# Altium footprint library microbuilder.PCBLIB: 422 footprints (part 8 of 27)
Each footprint in its own frame and in the unit in brackets; x right, y up, seen from the top. Pads: shape width x height; smd on the part's side, far side on the other; paste and mask are expansions set on the pad; w line width, h text height; cw(c..) or ccw(c..) is an arc to the next point about the centre after c.
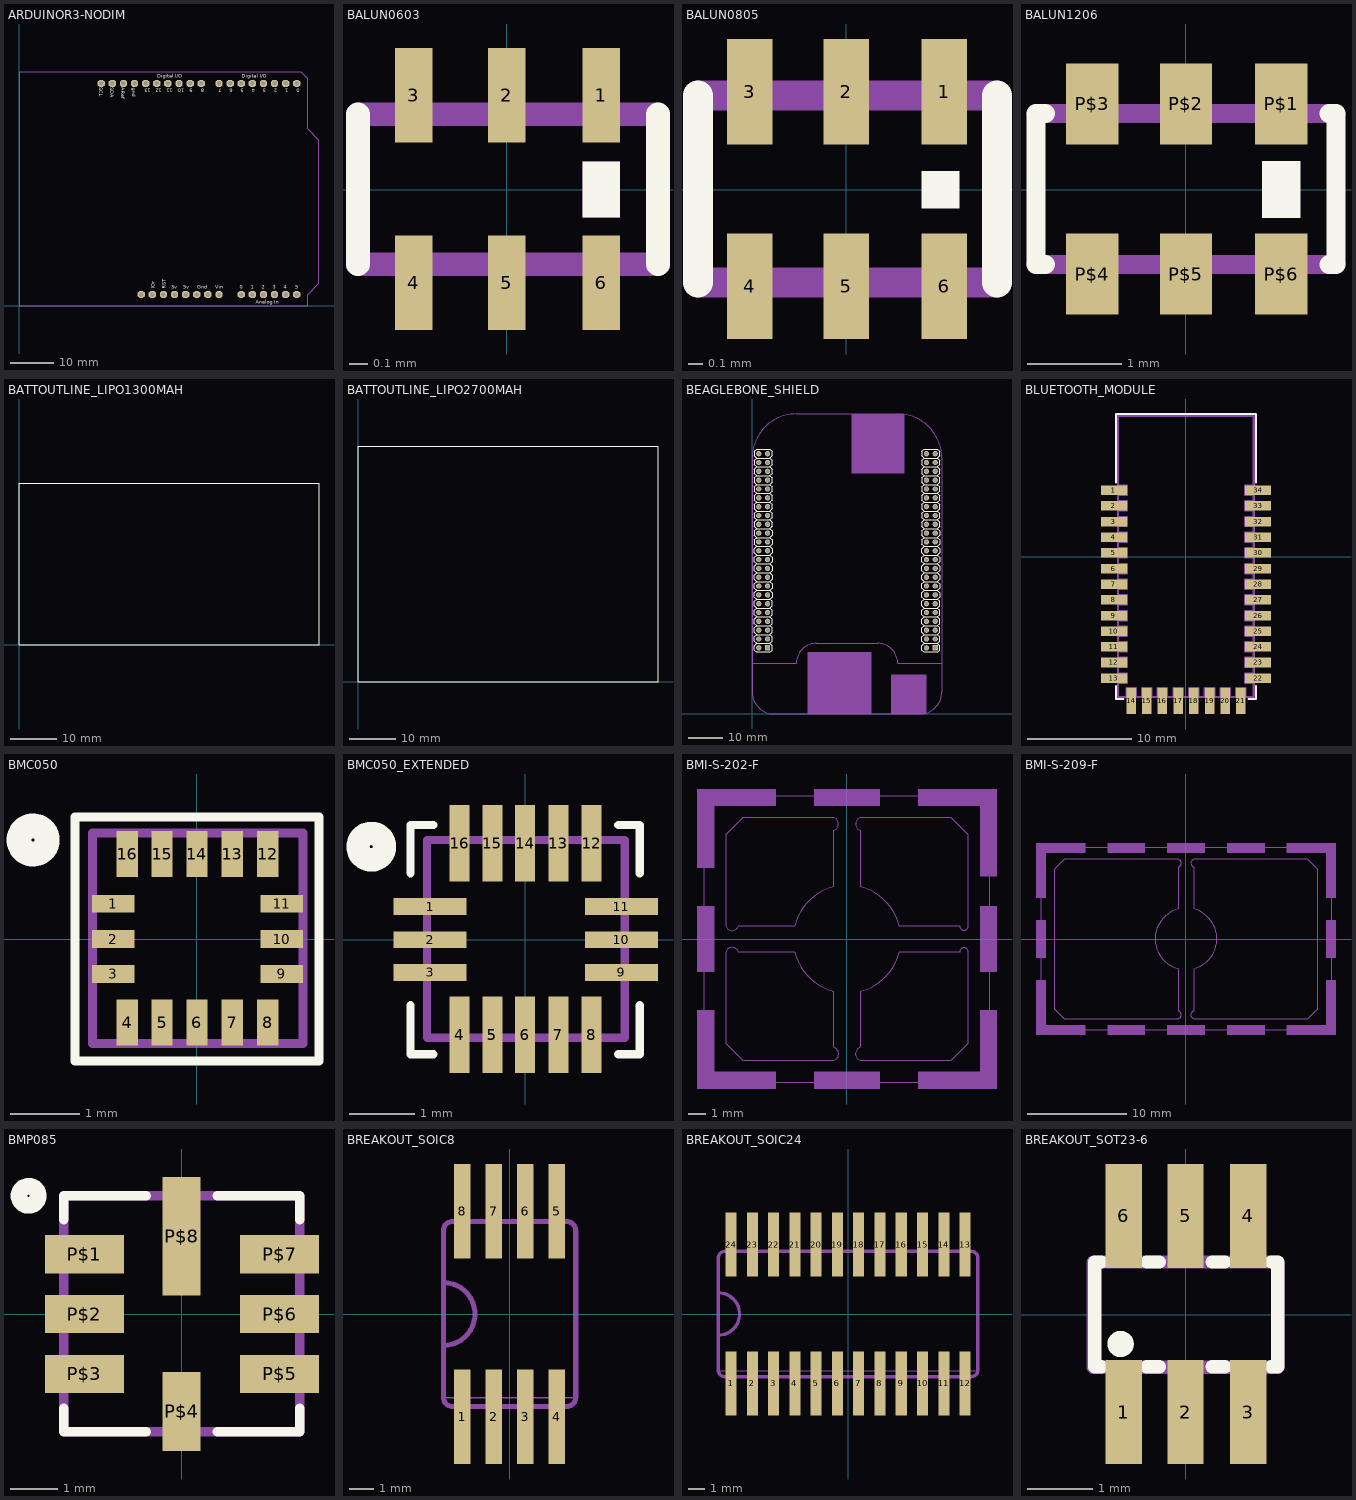
[diagram p7: the footprints below, top view; thin cyan lines are the x and y axes]

## ARDUINOR3-NODIM [mil]
pads (32):
  oct 66x66 hole 40: 3V(1400,100) 5V(1500,100) A0(2000,100) A1(2100,100) A2(2200,100) A3(2300,100) A4(2400,100) A5(2500,100) AREF(940,2000) D0(2500,2000) D1(2400,2000) D2(2300,2000) D3(2200,2000) D4(2100,2000) D5(2000,2000) D6(1900,2000) D7(1800,2000) D8(1640,2000) D9(1540,2000) D10(1440,2000) D11(1340,2000) D12(1240,2000) D13(1140,2000) GND(1040,2000) GND1(1700,100) GND2(1600,100) IOREF(1200,100) RESERVED(1100,100) RESET(1300,100) SCL(740,2000) SDA(840,2000) VIN(1800,100)
Top Overlay:
  text "RST" at 1320,150 h34
  text "3v" at 1369,150 h34
  text "5v" at 1479,150 h34
  text "Gnd" at 1606,150 h34
  text "Vin" at 1764,150 h34
  text "Analog In" at 2131,19 h34
  text "0" at 1985,150 h34
  text "1" at 2085,150 h34
  text "2" at 2185,150 h34
  text "3" at 2285,150 h34
  text "4" at 2385,150 h34
  text "5" at 2485,150 h34
  text "ARef" at 920,1965 h34
  text "gnd" at 1020,1960 h34
  text "13" at 1185,1950 h34
  text "12" at 1285,1950 h34
  text "11" at 1385,1950 h34
  text "10" at 1485,1950 h34
  text "9" at 1565,1950 h34
  text "8" at 1665,1950 h34
  text "7" at 1825,1950 h34
  text "6" at 1925,1950 h34
  text "5" at 2025,1950 h34
  text "4" at 2125,1950 h34
  text "3" at 2225,1950 h34
  text "2" at 2325,1950 h34
  text "1" at 2425,1950 h34
  text "0" at 2525,1950 h34
  text "Digital I/O" at 1245,2050 h34
  text "Digital I/O" at 2005,2050 h34
  text "SCL" at 720,1965 h34
  text "SDA" at 820,1965 h34
  text "IOr" at 1220,150 h34
Mechanical 16:
  lines w0: 0,0 2600,0 2600,100 2700,200 2700,1490 2600,1590 2600,2040 2540,2100 0,2100 0,0

## BALUN0603 [mil]
pads (6):
  rect 8x20 smd: 1(20,20) 2(0,20) 3(-19.68,20) 4(-19.68,-19.68) 5(0,-19.68) 6(20,-19.68)
Top Overlay:
  rectangle: 16,-5.91 24,6
  lines w5: -31.5,-15.75 -31.5,16 ; 32,-15.75 32,16
Mechanical 16:
  rectangle: 16,-5.91 24,6
  lines w5: -31.5,-15.75 32,-15.75 32,16 -31.5,16 -31.5,-15.75

## BALUN0805 [mil]
pads (6):
  rect 12x28 smd: 1(26,26) 2(0,26) 3(-25.59,26) 4(-25.59,-25.59) 5(0,-25.59) 6(26,-25.59)
Top Overlay:
  rectangle: 20,-5 30,5
  lines w8: -39.37,-24.61 -39.37,25 ; 40,-24.61 40,25
Mechanical 16:
  lines w5: -39.37,-24.61 -39.37,25 ; 40,-24.61 40,25
  lines w8: -39.37,-24.61 40,-24.61 ; -39.37,25 40,25

## BALUN1206 [mil]
pads (6):
  rect 22x34 smd: P$1(40,36) P$2(0,36) P$3(-39.37,36) P$4(-39.37,-35.43) P$5(0,-35.43) P$6(40,-35.43)
Top Overlay:
  rectangle: 32,-11.81 48,12
  lines w8: -59.06,-31.5 -62.99,-31.5 -62.99,32 -59.06,32 ; 60,-31.5 63,-31.5 63,32 60,32
Mechanical 16:
  lines w5: -62.99,-31.5 -62.99,32 ; 63,-31.5 63,32
  lines w8: -62.99,-31.5 63,-31.5 ; -62.99,32 63,32

## BATTOUTLINE_LIPO1300MAH [mil]
Top Overlay:
  lines w8: 0,0 0,1378 2560,1378 2560,0 0,0

## BATTOUTLINE_LIPO2700MAH [mil]
Top Overlay:
  lines w8: 0,0 0,2008 2560,2008 2560,0 0,0

## BEAGLEBONE_SHIELD [mil]
pads (92):
  rect 60x60 hole 40: 1(175,750) 47(2075,750)
  round 60 hole 40: 2(75,750) 3(175,850) 4(75,850) 5(175,950) 6(75,950) 7(175,1050) 8(75,1050) 9(175,1150) 10(75,1150) 11(175,1250) 12(75,1250) 13(175,1350) 14(75,1350) 15(175,1450) 16(75,1450) 17(175,1550) 18(75,1550) 19(175,1650) 20(75,1650) 21(175,1750) 22(75,1750) 23(175,1850) 24(75,1850) 25(175,1950) 26(75,1950) 27(175,2050) 28(75,2050) 29(175,2150) 30(75,2150) 31(175,2250) 32(75,2250) 33(175,2350) 34(75,2350) 35(175,2450) 36(75,2450) 37(175,2550) 38(75,2550) 39(175,2650) 40(75,2650) 41(175,2750) 42(75,2750) 43(175,2850) 44(75,2850) 45(175,2950) 46(75,2950) 48(1975,750) 49(2075,850) 50(1975,850) 51(2075,950) 52(1975,950) 53(2075,1050) 54(1975,1050) 55(2075,1150) 56(1975,1150) 57(2075,1250) 58(1975,1250) 59(2075,1350) 60(1975,1350) 61(2075,1450) 62(1975,1450) 63(2075,1550) 64(1975,1550) 65(2075,1650) 66(1975,1650) 67(2075,1750) 68(1975,1750) 69(2075,1850) 70(1975,1850) 71(2075,1950) 72(1975,1950) 73(2075,2050) 74(1975,2050) 75(2075,2150) 76(1975,2150) 77(2075,2250) 78(1975,2250) 79(2075,2350) 80(1975,2350) 81(2075,2450) 82(1975,2450) 83(2075,2550) 84(1975,2550) 85(2075,2650) 86(1975,2650) 87(2075,2750) 88(1975,2750) 89(2075,2850) 90(1975,2850) 91(2075,2950) 92(1975,2950)
Top Overlay:
  drawing of 324 lines, arcs and shapes, not listed
Mechanical 1:
  lines w5: 0,2900 cw(c500,2900) 500,3400 1650,3400 cw(c1650,2900) 2150,2900 ; 500,575 cw(c725,575) 725,800 ; 1425,800 cw(c1425,575) 1650,575
  lines w8: 0,2900 0,575 500,575 ; 725,800 1425,800 ; 1650,575 2150,575 2150,2900
Mechanical 16:
  region: 185,740 185,760 165,760 165,740
  region: 85,740 85,760 65,760 65,740
  region: 85,840 85,860 65,860 65,840
  region: 185,840 185,860 165,860 165,840
  region: 85,940 85,960 65,960 65,940
  region: 185,940 185,960 165,960 165,940
  region: 85,1040 85,1060 65,1060 65,1040
  region: 85,1140 85,1160 65,1160 65,1140
  region: 85,1240 85,1260 65,1260 65,1240
  region: 185,1040 185,1060 165,1060 165,1040
  region: 185,1140 185,1160 165,1160 165,1140
  region: 185,1240 185,1260 165,1260 165,1240
  region: 85,1340 85,1360 65,1360 65,1340
  region: 185,1340 185,1360 165,1360 165,1340
  region: 85,1440 85,1460 65,1460 65,1440
  region: 185,1440 185,1460 165,1460 165,1440
  region: 85,1540 85,1560 65,1560 65,1540
  region: 185,1540 185,1560 165,1560 165,1540
  region: 85,1640 85,1660 65,1660 65,1640
  region: 185,1640 185,1660 165,1660 165,1640
  region: 85,1740 85,1760 65,1760 65,1740
  region: 185,1740 185,1760 165,1760 165,1740
  region: 85,1840 85,1860 65,1860 65,1840
  region: 185,1840 185,1860 165,1860 165,1840
  region: 85,1940 85,1960 65,1960 65,1940
  region: 185,1940 185,1960 165,1960 165,1940
  region: 85,2040 85,2060 65,2060 65,2040
  region: 185,2040 185,2060 165,2060 165,2040
  region: 85,2140 85,2160 65,2160 65,2140
  region: 185,2140 185,2160 165,2160 165,2140
  region: 85,2240 85,2260 65,2260 65,2240
  region: 185,2240 185,2260 165,2260 165,2240
  region: 85,2340 85,2360 65,2360 65,2340
  region: 185,2340 185,2360 165,2360 165,2340
  region: 85,2440 85,2460 65,2460 65,2440
  region: 185,2440 185,2460 165,2460 165,2440
  region: 85,2540 85,2560 65,2560 65,2540
  region: 185,2540 185,2560 165,2560 165,2540
  region: 85,2640 85,2660 65,2660 65,2640
  region: 185,2640 185,2660 165,2660 165,2640
  region: 85,2740 85,2760 65,2760 65,2740
  region: 185,2740 185,2760 165,2760 165,2740
  region: 85,2840 85,2860 65,2860 65,2840
  region: 185,2840 185,2860 165,2860 165,2840
  region: 85,2940 85,2960 65,2960 65,2940
  region: 185,2940 185,2960 165,2960 165,2940
  region: 2085,740 2085,760 2065,760 2065,740
  region: 1985,740 1985,760 1965,760 1965,740
  region: 1985,840 1985,860 1965,860 1965,840
  region: 2085,840 2085,860 2065,860 2065,840
  region: 1985,940 1985,960 1965,960 1965,940
  region: 2085,940 2085,960 2065,960 2065,940
  region: 1985,1040 1985,1060 1965,1060 1965,1040
  region: 1985,1140 1985,1160 1965,1160 1965,1140
  region: 1985,1240 1985,1260 1965,1260 1965,1240
  region: 2085,1040 2085,1060 2065,1060 2065,1040
  region: 2085,1140 2085,1160 2065,1160 2065,1140
  region: 2085,1240 2085,1260 2065,1260 2065,1240
  region: 1985,1340 1985,1360 1965,1360 1965,1340
  region: 2085,1340 2085,1360 2065,1360 2065,1340
  region: 1985,1440 1985,1460 1965,1460 1965,1440
  region: 2085,1440 2085,1460 2065,1460 2065,1440
  region: 1985,1540 1985,1560 1965,1560 1965,1540
  region: 2085,1540 2085,1560 2065,1560 2065,1540
  region: 1985,1640 1985,1660 1965,1660 1965,1640
  region: 2085,1640 2085,1660 2065,1660 2065,1640
  region: 1985,1740 1985,1760 1965,1760 1965,1740
  region: 2085,1740 2085,1760 2065,1760 2065,1740
  region: 1985,1840 1985,1860 1965,1860 1965,1840
  region: 2085,1840 2085,1860 2065,1860 2065,1840
  region: 1985,1940 1985,1960 1965,1960 1965,1940
  region: 2085,1940 2085,1960 2065,1960 2065,1940
  region: 1985,2040 1985,2060 1965,2060 1965,2040
  region: 2085,2040 2085,2060 2065,2060 2065,2040
  region: 1985,2140 1985,2160 1965,2160 1965,2140
  region: 2085,2140 2085,2160 2065,2160 2065,2140
  region: 1985,2240 1985,2260 1965,2260 1965,2240
  region: 2085,2240 2085,2260 2065,2260 2065,2240
  region: 1985,2340 1985,2360 1965,2360 1965,2340
  region: 2085,2340 2085,2360 2065,2360 2065,2340
  region: 1985,2440 1985,2460 1965,2460 1965,2440
  region: 2085,2440 2085,2460 2065,2460 2065,2440
  region: 1985,2540 1985,2560 1965,2560 1965,2540
  region: 2085,2540 2085,2560 2065,2560 2065,2540
  region: 1985,2640 1985,2660 1965,2660 1965,2640
  region: 2085,2640 2085,2660 2065,2660 2065,2640
  region: 1985,2740 1985,2760 1965,2760 1965,2740
  region: 2085,2740 2085,2760 2065,2760 2065,2740
  region: 1985,2840 1985,2860 1965,2860 1965,2840
  region: 2085,2840 2085,2860 2065,2860 2065,2840
  region: 1985,2940 1985,2960 1965,2960 1965,2940
  region: 2085,2940 2085,2960 2065,2960 2065,2940
  lines w8: 0,575 0,250 ccw(c250,250) 250,0 1900,0 ccw(c1900,250) 2150,250 2150,575
  text "P8" at 100,3050 h77.5
  text "P9" at 2000,3050 h77.5
Mechanical 27:
  rectangle: 1125,2725 1725,3400
  rectangle: 1575,0 1975,450
  rectangle: 625,0 1350,700

## BLUETOOTH_MODULE [mil]
pads (34):
  rect 99x36 smd: 1(-271.65,250) 2(-271.65,191) 3(-271.65,132) 4(-271.65,73) 5(-271.65,14) 6(-271.65,-45.28) 7(-271.65,-104.33) 8(-271.65,-163.39) 9(-271.65,-222.44) 10(-271.65,-281.5) 11(-271.65,-340.55) 12(-271.65,-399.61) 13(-271.65,-458.66) 22(272,-458.66) 23(272,-399.61) 24(272,-340.55) 25(272,-281.5) 26(272,-222.44) 27(272,-163.39) 28(272,-104.33) 29(272,-45.28) 30(272,14) 31(272,73) 32(272,132) 33(272,191) 34(272,250)
  rect 36x99 smd: 14(-206.69,-544.49) 15(-147.64,-544.49) 16(-88.58,-544.49) 17(-29.53,-544.49) 18(30,-544.49) 19(89,-544.49) 20(148,-544.49) 21(207,-544.49)
Top Overlay:
  lines w8: -263.78,-488.19 -263.78,-537.4 -236.22,-537.4 ; -263.78,280 -263.78,538 264,538 264,280 ; 237,-537.4 264,-537.4 264,-488.19
Top Paste:
  rectangle: -320.87,174 -246.06,209
  rectangle: -246.06,184 -222.44,199
  rectangle: -320.87,233 -246.06,268
  rectangle: -246.06,243 -222.44,258
  rectangle: -320.87,115 -246.06,150
  rectangle: -246.06,125 -222.44,140
  rectangle: -320.87,56 -246.06,91
  rectangle: -246.06,65 -222.44,81
  rectangle: -320.87,-3.94 -246.06,32
  rectangle: -246.06,6 -222.44,22
  rectangle: -320.87,-62.99 -246.06,-27.56
  rectangle: -246.06,-53.15 -222.44,-37.4
  rectangle: -320.87,-122.05 -246.06,-86.61
  rectangle: -246.06,-112.2 -222.44,-96.46
  rectangle: -320.87,-181.1 -246.06,-145.67
  rectangle: -246.06,-171.26 -222.44,-155.51
  region: -188.98,-594.49 -188.98,-519.68 -224.41,-519.68 -224.41,-594.49
  region: -198.82,-519.69 -198.82,-496.06 -214.57,-496.06 -214.57,-519.69
  rectangle: -320.87,-240.16 -246.06,-204.72
  rectangle: -246.06,-230.31 -222.44,-214.57
  rectangle: -320.87,-299.21 -246.06,-263.78
  rectangle: -246.06,-289.37 -222.44,-273.62
  rectangle: -320.87,-358.27 -246.06,-322.83
  rectangle: -246.06,-348.43 -222.44,-332.68
  rectangle: -320.87,-417.32 -246.06,-381.89
  rectangle: -246.06,-407.48 -222.44,-391.73
  rectangle: -320.87,-476.38 -246.06,-440.94
  rectangle: -246.06,-466.54 -222.44,-450.79
  region: 321,-381.89 247,-381.89 247,-417.32 321,-417.32
  region: 247,-391.73 223,-391.73 223,-407.48 247,-407.48
  region: 321,-322.83 247,-322.83 247,-358.27 321,-358.27
  region: 247,-332.68 223,-332.68 223,-348.43 247,-348.43
  region: 321,-263.78 247,-263.78 247,-299.21 321,-299.21
  region: 247,-273.62 223,-273.62 223,-289.37 247,-289.37
  region: 321,-204.72 247,-204.72 247,-240.16 321,-240.16
  region: 247,-214.57 223,-214.57 223,-230.31 247,-230.31
  region: 321,-145.67 247,-145.67 247,-181.1 321,-181.1
  region: 247,-155.51 223,-155.51 223,-171.26 247,-171.26
  region: 321,-86.61 247,-86.61 247,-122.05 321,-122.05
  region: 247,-96.46 223,-96.46 223,-112.2 247,-112.2
  region: 321,-27.56 247,-27.56 247,-62.99 321,-62.99
  region: 247,-37.4 223,-37.4 223,-53.15 247,-53.15
  region: 321,32 247,32 247,-3.94 321,-3.94
  region: 247,22 223,22 223,6 247,6
  region: 321,91 247,91 247,56 321,56
  region: 247,81 223,81 223,65 247,65
  region: 321,150 247,150 247,115 321,115
  region: 247,140 223,140 223,125 247,125
  region: 321,209 247,209 247,174 321,174
  region: 247,199 223,199 223,184 247,184
  region: 321,268 247,268 247,233 321,233
  region: 247,258 223,258 223,243 247,243
  region: 321,-440.94 247,-440.94 247,-476.38 321,-476.38
  region: 247,-450.79 223,-450.79 223,-466.54 247,-466.54
  region: -129.92,-594.49 -129.92,-519.68 -165.35,-519.68 -165.35,-594.49
  region: -139.76,-519.69 -139.76,-496.06 -155.51,-496.06 -155.51,-519.69
  region: -70.87,-594.49 -70.87,-519.68 -106.3,-519.68 -106.3,-594.49
  region: -80.71,-519.69 -80.71,-496.06 -96.46,-496.06 -96.46,-519.69
  region: -11.75,-594.55 -11.75,-519.62 -47.18,-519.62 -47.18,-594.55
  region: -21.65,-519.69 -21.65,-496.06 -37.4,-496.06 -37.4,-519.69
  region: 47.28,-594.52 47.28,-519.65 11.85,-519.65 11.85,-594.52
  region: 37.87,-519.87 37.87,-495.87 22.13,-495.87 22.13,-519.87
  region: 106.72,-594.09 106.72,-520.09 71.28,-520.09 71.28,-594.09
  region: 96.87,-519.87 96.87,-495.87 81.13,-495.87 81.13,-519.87
  region: 166.22,-594.59 166.22,-519.59 130.78,-519.59 130.78,-594.59
  region: 155.87,-519.87 155.87,-495.87 140.13,-495.87 140.13,-519.87
  region: 225.22,-594.59 225.22,-519.59 189.78,-519.59 189.78,-594.59
  region: 214.87,-519.87 214.87,-495.87 199.13,-495.87 199.13,-519.87
Mechanical 16:
  drawing of 378 lines, arcs and shapes, not listed
  text "1" at -208.66,241 h37.2
  text "34" at 174,237 h37.2

## BMC050 [mil]
pads (16):
  rect 24x10 smd: 1(-47.24,20) 2(-47.24,0) 3(-47.24,-19.68) 9(48,-19.68) 10(48,0) 11(48,20)
  rect 12x26 smd: 4(-39.37,-47.24) 5(-19.68,-47.24) 6(0,-47.24) 7(20,-47.24) 8(40,-47.24) 12(40,48) 13(20,48) 14(0,48) 15(-19.68,48) 16(-39.37,48)
Top Overlay:
  circle w14: c-92.52,56 r8
  lines w5: -68.9,-68.9 69,-68.9 69,69 -68.9,69 -68.9,-68.9
Mechanical 16:
  lines w5: -59.06,-59.06 60,-59.06 60,60 -59.06,60 -59.06,-59.06

## BMC050_EXTENDED [mil]
pads (16):
  rect 44x10 smd: 1(-57.09,20) 2(-57.09,0) 3(-57.09,-19.68) 9(58,-19.68) 10(58,0) 11(58,20)
  rect 12x46 smd: 4(-39.37,-57.09) 5(-19.68,-57.09) 6(0,-57.09) 7(20,-57.09) 8(40,-57.09) 12(40,58) 13(20,58) 14(0,58) 15(-19.68,58) 16(-39.37,58)
Top Overlay:
  circle w14: c-92.52,56 r8
  lines w5: -68.9,-39.37 -68.9,-68.9 -55.12,-68.9 ; -68.9,40 -68.9,69 -55.12,69 ; 56,-68.9 69,-68.9 69,-39.37 ; 56,69 69,69 69,40
Mechanical 16:
  lines w5: -59.06,-59.06 60,-59.06 60,60 -59.06,60 -59.06,-59.06

## BMI-S-202-F [mil]
Top Paste:
  rectangle: -340.55,-340.55 -301.18,-161.42
  rectangle: -340.55,-74.8 -301.18,75
  rectangle: -340.55,162 -301.18,341
  rectangle: -340.55,-340.55 -161.42,-301.18
  rectangle: -74.8,-340.55 75,-301.18
  rectangle: 162,-340.55 341,-301.18
  rectangle: 302,-340.55 341,-161.42
  rectangle: 302,-74.8 341,75
  rectangle: 302,142 341,341
  rectangle: -340.55,302 -161.42,341
  rectangle: 162,302 341,341
  rectangle: -74.8,302 75,341
Top Solder:
  rectangle: -340.55,-340.55 -301.18,-161.42
  rectangle: -340.55,-74.8 -301.18,75
  rectangle: -340.55,162 -301.18,341
  rectangle: -340.55,-340.55 -161.42,-301.18
  rectangle: -74.8,-340.55 75,-301.18
  rectangle: 162,-340.55 341,-301.18
  rectangle: 302,-340.55 341,-161.42
  rectangle: 302,-74.8 341,75
  rectangle: 302,142 341,341
  rectangle: -340.55,302 -161.42,341
  rectangle: 162,302 341,341
  rectangle: -74.8,302 75,341
Mechanical 16:
  lines w0: -324.8,-324.8 -324.8,325 325,325 325,-324.8 -324.8,-324.8 ; -275.59,-236.22 -275.59,-29.53 cw(c-260.83,-34.45) -246.06,-29.53 -118.11,-29.53 ccw(c0,0) -29.53,-118.11 -29.53,-246.06 cw(c-34.45,-260.83) -29.53,-275.59 -236.22,-275.59 -275.59,-236.22 ; -275.59,30 ccw(c-260.83,34.92) -246.06,30 -118.11,30 cw(c0.35,0.68) -29.53,119 -29.53,247 ccw(c-34.36,261.5) -29.53,276 -236.22,276 -275.59,237 -275.59,30 ; 30,-275.59 cw(c34.92,-260.83) 30,-246.06 30,-118.11 ccw(c0.68,0.35) 119,-29.53 256,-29.53 cw(c266,-29.53) 276,-29.53 276,-236.22 237,-275.59 30,-275.59 ; 30,119 30,247 cw(c34.83,261.5) 30,276 237,276 276,237 276,30 cw(c266,30) 256,30 119,30 ccw(c0.33,0.33) 30,119
Mechanical 27:
  rectangle: -340.55,-340.55 -301.18,-161.42
  rectangle: -340.55,-74.8 -301.18,75
  rectangle: -340.55,162 -301.18,341
  rectangle: -340.55,-340.55 -161.42,-301.18
  rectangle: -74.8,-340.55 75,-301.18
  rectangle: 162,-340.55 341,-301.18
  rectangle: 302,-340.55 341,-161.42
  rectangle: 302,-74.8 341,75
  rectangle: 302,142 341,341
  rectangle: -340.55,302 -161.42,341
  rectangle: 162,302 341,341
  rectangle: -74.8,302 75,341

## BMI-S-209-F [mil]
Top Paste:
  rectangle: -593.7,-379.92 -397.64,-340.55
  rectangle: -311.02,-379.92 -161.42,-340.55
  rectangle: -74.8,-379.92 75,-340.55
  rectangle: 162,-379.92 312,-340.55
  rectangle: 398,-379.92 594,-340.55
  rectangle: -593.7,-379.92 -554.33,-161.42
  rectangle: -593.7,-74.8 -554.33,75
  rectangle: -593.7,162 -554.33,380
  rectangle: -593.7,341 -397.64,380
  rectangle: -311.02,341 -161.42,380
  rectangle: -74.8,341 75,380
  rectangle: 162,341 312,380
  rectangle: 398,341 594,380
  rectangle: 555,-379.92 594,-161.42
  rectangle: 555,162 594,380
  rectangle: 555,-74.8 594,75
Top Solder:
  rectangle: -593.7,-379.92 -397.64,-340.55
  rectangle: -311.02,-379.92 -161.42,-340.55
  rectangle: -74.8,-379.92 75,-340.55
  rectangle: 162,-379.92 312,-340.55
  rectangle: 398,-379.92 594,-340.55
  rectangle: -593.7,-379.92 -554.33,-161.42
  rectangle: -593.7,-74.8 -554.33,75
  rectangle: -593.7,162 -554.33,380
  rectangle: -593.7,341 -397.64,380
  rectangle: -311.02,341 -161.42,380
  rectangle: -74.8,341 75,380
  rectangle: 162,341 312,380
  rectangle: 398,341 594,380
  rectangle: 555,-379.92 594,-161.42
  rectangle: 555,162 594,380
  rectangle: 555,-74.8 594,75
Mechanical 16:
  lines w0: -574.02,-360.24 -574.02,361 575,361 575,-360.24 -574.02,-360.24 ; -521.65,-275.59 -482.28,-314.96 -29.53,-314.96 ccw(c-34.45,-300.2) -29.53,-285.43 -29.53,-118.11 cw(c0.11,0.44) -29.53,119 -29.53,286 ccw(c-34.36,300.5) -29.53,315 -482.28,315 -521.65,276 -521.65,-275.59 ; 30,-314.96 cw(c34.92,-300.2) 30,-285.43 30,-118.11 ccw(c0.36,0.44) 30,119 30,286 cw(c34.83,300.5) 30,315 483,315 522,276 522,-275.59 483,-314.96 30,-314.96
Mechanical 27:
  rectangle: -593.7,-379.92 -397.64,-340.55
  rectangle: -311.02,-379.92 -161.42,-340.55
  rectangle: -74.8,-379.92 75,-340.55
  rectangle: 162,-379.92 312,-340.55
  rectangle: 398,-379.92 594,-340.55
  rectangle: -593.7,-379.92 -554.33,-161.42
  rectangle: -593.7,-74.8 -554.33,75
  rectangle: -593.7,162 -554.33,380
  rectangle: -593.7,341 -397.64,380
  rectangle: -311.02,341 -161.42,380
  rectangle: -74.8,341 75,380
  rectangle: 162,341 312,380
  rectangle: 398,341 594,380
  rectangle: 555,-379.92 594,-161.42
  rectangle: 555,162 594,380
  rectangle: 555,-74.8 594,75

## BMP085 [mil]
pads (8):
  rect 66x32 smd: P$1(-81.3,50) P$2(-81.3,0) P$3(-81.3,-50) P$5(82,-50) P$6(82,0) P$7(82,50)
  rect 32x66 smd: P$4(0,-81.3)
  rect 32x99 smd: P$8(0,65)
Top Overlay:
  circle w14: c-127.95,99 r8
  lines w8: -98.43,-78.74 -98.43,-98.43 -29.53,-98.43 ; -98.43,79 -98.43,99 -29.53,99 ; 30,-98.43 99,-98.43 99,-78.74 ; 30,99 99,99 99,79
Mechanical 16:
  lines w8: -98.43,-98.43 99,-98.43 99,99 -98.43,99 -98.43,-98.43

## BREAKOUT_SOIC8 [mil]
pads (8):
  rect 26x150 smd: 1(-75,-163) 2(-25,-163) 3(25,-163) 4(75,-163) 5(75,163) 6(25,163) 7(-25,163) 8(-75,163)
Mechanical 16:
  rectangle: -85,-152 -65,-147
  rectangle: -85,-210 -65,-152
  rectangle: -35,-152 -15,-147
  rectangle: -35,-210 -15,-152
  rectangle: 15,-152 35,-147
  rectangle: 15,-210 35,-152
  rectangle: 65,-152 85,-147
  rectangle: 65,-210 85,-152
  rectangle: -85,152 -65,210
  rectangle: -85,147 -65,152
  rectangle: -35,147 -15,152
  rectangle: -35,152 -15,210
  rectangle: 15,147 35,152
  rectangle: 15,152 35,210
  rectangle: 65,147 85,152
  rectangle: 65,152 85,210
  lines w2: -105,-133 105,-133
  lines w8: -105,-50 -105,50 ; -105,-50 -105,-132 ccw(c-90,-132) -90,-147 90,-147 ccw(c90,-132) 105,-132 105,132 ccw(c90,132) 90,147 -90,147 ccw(c-90,132) -105,132 -105,50 ; -105,-50 ccw(c-105,0) -105,50

## BREAKOUT_SOIC24 [mil]
pads (24):
  rect 26x150 smd: 1(-275,-163) 2(-225,-163) 3(-175,-163) 4(-125,-163) 5(-75,-163) 6(-25,-163) 7(25,-163) 8(75,-163) 9(125,-163) 10(175,-163) 11(225,-163) 12(275,-163) 13(275,163) 14(225,163) 15(175,163) 16(125,163) 17(75,163) 18(25,163) 19(-25,163) 20(-75,163) 21(-125,163) 22(-175,163) 23(-225,163) 24(-275,163)
Mechanical 16:
  rectangle: -285,-152 -265,-147
  rectangle: -285,-210 -265,-152
  rectangle: -235,-152 -215,-147
  rectangle: -235,-210 -215,-152
  rectangle: -185,-152 -165,-147
  rectangle: -185,-210 -165,-152
  rectangle: -135,-152 -115,-147
  rectangle: -135,-210 -115,-152
  rectangle: -85,-210 -65,-152
  rectangle: -85,-152 -65,-147
  rectangle: -35,-152 -15,-147
  rectangle: -35,-210 -15,-152
  rectangle: 15,-152 35,-147
  rectangle: 15,-210 35,-152
  rectangle: 65,-152 85,-147
  rectangle: 65,-210 85,-152
  rectangle: -285,152 -265,210
  rectangle: -285,147 -265,152
  rectangle: -235,147 -215,152
  rectangle: -235,152 -215,210
  rectangle: -185,147 -165,152
  rectangle: -185,152 -165,210
  rectangle: -135,147 -115,152
  rectangle: -135,152 -115,210
  rectangle: -85,147 -65,152
  rectangle: -85,152 -65,210
  rectangle: -35,147 -15,152
  rectangle: -35,152 -15,210
  rectangle: 15,147 35,152
  rectangle: 15,152 35,210
  rectangle: 65,147 85,152
  rectangle: 65,152 85,210
  rectangle: 115,147 135,152
  rectangle: 165,147 185,152
  rectangle: 215,147 235,152
  rectangle: 265,147 285,152
  rectangle: 115,152 135,210
  rectangle: 165,152 185,210
  rectangle: 215,152 235,210
  rectangle: 265,152 285,210
  rectangle: 115,-152 135,-147
  rectangle: 165,-152 185,-147
  rectangle: 215,-152 235,-147
  rectangle: 265,-152 285,-147
  rectangle: 115,-210 135,-152
  rectangle: 165,-210 185,-152
  rectangle: 215,-210 235,-152
  rectangle: 265,-210 285,-152
  lines w2: -305,-133 305,-133
  lines w8: -305,-50 -305,50 ; -305,-50 -305,-132 ccw(c-290,-132) -290,-147 290,-147 ccw(c290,-132) 305,-132 305,132 ccw(c290,132) 290,147 -290,147 ccw(c-290,132) -305,132 -305,50 ; -305,-50 ccw(c-305,0) -305,50

## BREAKOUT_SOT23-6 [mil]
pads (6):
  rect 22x63 smd: 1(-37.4,-59.06) 2(0,-59.06) 3(38,-59.06) 4(38,60) 5(0,60) 6(-37.4,60)
Top Overlay:
  circle w8: c-39.37,-17.72 r4
  lines w8: -51.18,-31.5 -55.12,-31.5 -55.12,32 -51.18,32 ; -23.62,-31.5 -15.75,-31.5 ; -23.62,32 -15.75,32 ; 16,-31.5 24,-31.5 ; 16,32 24,32 ; 52,-31.5 56,-31.5 56,32 52,32
Mechanical 16:
  rectangle: -47.24,-59.06 -27.56,-33.46
  rectangle: -9.84,-59.06 10,-33.46
  rectangle: 28,-59.06 48,-33.46
  rectangle: 28,34 48,60
  rectangle: -9.84,34 10,60
  rectangle: -47.24,34 -27.56,60
  lines w8: -55.98,-31.89 56,-31.89 56,32 -55.98,32 -55.98,-31.89